# Altium footprint library AD_Lib.PcbLib: 508 footprints (part 2 of 32)
Each footprint in its own frame and in the unit in brackets; x right, y up, seen from the top. Pads: shape width x height; smd on the part's side, far side on the other; paste and mask are expansions set on the pad; w line width, h text height; cw(c..) or ccw(c..) is an arc to the next point about the centre after c.
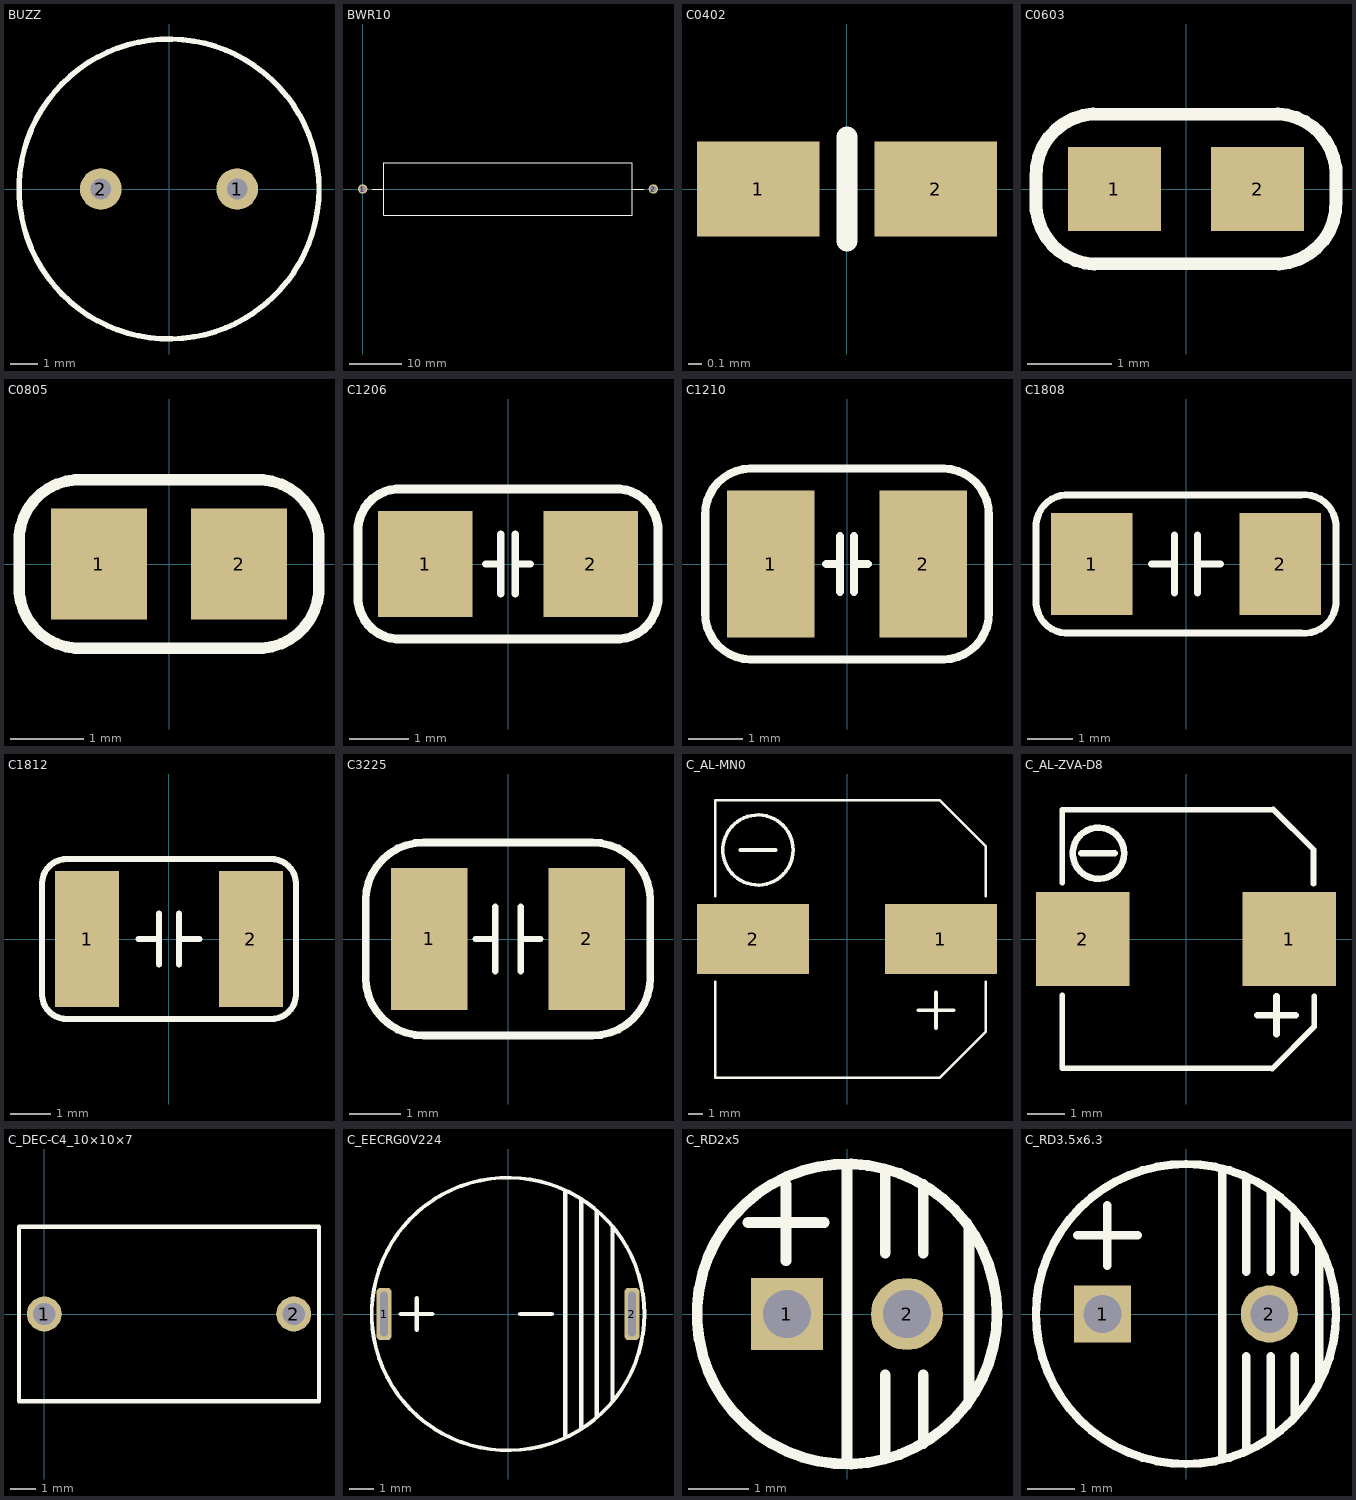
[diagram p1: the footprints below, top view; thin cyan lines are the x and y axes]

## BUZZ [mil]
height 104
pads (2):
  round 60 hole 30: 1(98.43,0) 2(-98.43,0)
Top Overlay:
  circle w7.87: c0,0 r216.54

## BWR10 [mm] "KOA之BWR10系列水泥电阻，10W"
height 8.6
pads (2):
  round 1.8 hole 1.2: 1(0,0) 2(55.88,0)
Top Overlay:
  lines w0.2: 1.8,0 4.075,0 ; 51.805,0 54.08,0 ; 4.075,0 4.075,5.08 51.805,5.08 51.805,-5.08 4.075,-5.08 4.075,0

## C0402 [mm] "贴片电容，耐压10V"
pads (2):
  rect 0.9x0.7 smd: 1(-0.65,0) 2(0.65,0)
Top Overlay:
  lines w0.152: 0,-0.381 0,0.381

## C0603 [mm] "公制1608；英制0603"
height 0.4
pads (2):
  rect 1.1x1 smd: 1(-0.85,0) 2(0.85,0)
Top Overlay:
  lines w0.152: -1.782,-0.254 -1.782,0.133 cw(c-1.06,0.171) -0.977,0.889 ; -1.778,-0.254 ccw(c-1.06,-0.171) -0.977,-0.889 ; -1.143,-0.889 1.143,-0.889 ; -1.143,0.889 1.143,0.889 ; 0.977,-0.889 ccw(c1.06,-0.171) 1.782,-0.133 1.782,0.254 ; 0.977,0.889 cw(c1.06,0.171) 1.778,0.254

## C0805 [mm] "公制2012；英制0805"
height 0.5
pads (2):
  rect 1.3x1.5 smd: 1(-0.95,0) 2(0.95,0)
Top Overlay:
  lines w0.152: -2.032,-0.254 ccw(c-1.206,-0.318) -1.27,-1.143 1.27,-1.143 ccw(c1.206,-0.318) 2.032,-0.254 2.032,0.254 ccw(c1.206,0.318) 1.27,1.143 -1.27,1.143 ccw(c-1.206,0.318) -2.032,0.254 -2.032,-0.254

## C1206 [mm] "公制3216；英制1206；"
height 0.71
pads (2):
  rect 1.6x1.8 smd: 1(-1.4,0) 2(1.4,0)
Top Overlay:
  lines w0.127: -0.381,0 -0.127,0 ; -0.127,-0.508 -0.127,0.508 ; 0.127,-0.508 0.127,0.508 ; 0.127,0 0.381,0
  lines w0.152: -2.54,-0.635 ccw(c-1.841,-0.572) -1.778,-1.27 1.778,-1.27 ccw(c1.841,-0.572) 2.54,-0.635 2.54,0.635 ccw(c1.841,0.572) 1.778,1.27 -1.778,1.27 ccw(c-1.841,0.572) -2.54,0.635 -2.54,-0.635

## C1210 [mm] "Chip Capacitor; Body 1.2x 1.0 mm (LxW typ)"
height 2.03
pads (2):
  rect 1.6x2.7 smd: 1(-1.4,0) 2(1.4,0)
Top Overlay:
  lines w0.152: -0.381,0 -0.127,0 ; -0.127,-0.508 -0.127,0.508 ; 0.127,-0.508 0.127,0.508 ; 0.127,0 0.381,0 ; -2.6,-0.889 ccw(c-1.759,-0.908) -1.778,-1.75 1.778,-1.75 ccw(c1.759,-0.908) 2.6,-0.889 2.6,0.889 ccw(c1.759,0.908) 1.778,1.75 -1.778,1.75 ccw(c-1.759,0.908) -2.6,0.889 -2.6,-0.889

## C1808 [mm] "Chip Capacitor; Body 4.5 x 2.0 mm (LxW typ)"
height 2.03
pads (2):
  rect 1.8x2.25 smd: 1(-2.075,0) 2(2.075,0)
Top Overlay:
  lines w0.152: -2.667,-1.524 2.54,-1.524 ccw(c2.603,-0.826) 3.302,-0.889 3.302,0.889 ccw(c2.603,0.826) 2.54,1.524 -2.667,1.524 -2.54,1.524 ccw(c-2.603,0.826) -3.302,0.889 -3.302,-0.889 ccw(c-2.603,-0.826) -2.54,-1.524 ; -0.762,0 -0.254,0 ; -0.254,-0.635 -0.254,0.635 ; 0.254,-0.635 0.254,0.635 ; 0.254,0 0.762,0

## C1812 [mm] "公制4832；英制1812；"
height 0.7
pads (2):
  rect 1.6x3.4 smd: 1(-2.05,0) 2(2.05,0)
Top Overlay:
  lines w0.152: -0.762,0 -0.254,0 ; -0.254,-0.635 -0.254,0.635 ; 0.254,-0.635 0.254,0.635 ; 0.254,0 0.762,0 ; -3.175,-1.397 ccw(c-2.556,-1.381) -2.54,-2 2.54,-2 ccw(c2.556,-1.381) 3.175,-1.397 3.175,1.397 ccw(c2.556,1.381) 2.54,2 -2.54,2 ccw(c-2.556,1.381) -3.175,1.397 -3.175,-1.397

## C3225 [mm] "公制3225；英制1210； IPC Low Density"
height 1.35
pads (2):
  rect 1.5x2.8 smd: 1(-1.55,0) 2(1.55,0)
Top Overlay:
  lines w0.127: -0.635,0 -0.254,0 ; -0.254,-0.635 -0.254,0.635 ; 0.254,-0.635 0.254,0.635 ; 0.254,0 0.635,0
  lines w0.152: -2.8,-0.762 ccw(c-1.656,-0.757) -1.651,-1.9 1.651,-1.9 ccw(c1.656,-0.757) 2.8,-0.762 2.8,0.762 ccw(c1.656,0.757) 1.651,1.9 -1.651,1.9 ccw(c-1.656,0.757) -2.8,0.762 -2.8,-0.762

## C_AL-MN0 [mm] "铝聚合物电容；MVY系列，MN0；EMVY350GDA222MMN0S"
height 22
pads (2):
  rect 8x5 smd: 1(6.7,0) 2(-6.7,0)
Top Overlay:
  circle w0.254: c-6.35,6.35 r2.502
  lines w0.178: -9.398,-3.048 -9.398,-9.906 6.604,-9.906 9.906,-6.604 9.906,-3.048 ; -9.398,3.048 -9.398,9.906 6.604,9.906 9.906,6.604 9.906,3.048
  lines w0.254: -7.62,6.35 -5.08,6.35 ; 5.08,-5.08 7.62,-5.08 ; 6.35,-6.35 6.35,-3.81

## C_AL-ZVA-D8 [mm] "Panasonic， Series : ZA  Type : V"
height 8
pads (2):
  rect 2.5x2.5 smd paste-0.051 mask+0.076: 1(2.75,0) 2(-2.75,0)
Top Overlay:
  circle w0.178: c-2.335,2.286 r0.684
  lines w0.152: -3.3,-1.5 -3.3,-3.45 2.3,-3.45 ; -3.3,1.5 -3.3,3.45 ; -3.285,3.45 2.3,3.45 ; 2.303,-3.454 3.408,-2.349 ; 2.329,3.454 3.4,2.383 3.4,1.473 ; 3.421,-2.337 3.421,-1.524
  lines w0.178: -2.794,2.286 -1.905,2.286 ; 1.905,-2.032 2.921,-2.032 ; 2.413,-2.54 2.413,-1.524

## C_DEC-C4_10×10×7 [mm] "Muruta之DE系列高压瓷片电容，引脚间距=10mm，尺寸 = D × F × T"
height 12.5
pads (2):
  round 1.4 hole 0.9: 1(0,0) 2(10,0)
Top Overlay:
  lines w0.178: -1.016,-3.5 11.016,-3.5 11.016,3.5 -1.016,3.5 -1.016,-3.5

## C_EECRG0V224 [mm] "超级电容，Panasonic之EECRG0V224H"
height 6
pads (2):
  rrect50% 0.6x2.1 hole 0.3 slot 1.8 at 90 deg: 1(-5,0) 2(5,0)
Top Overlay:
  circle w0.152: c0,0 r5.5
  lines w0.178: -4.318,0 -3.048,0 ; -3.683,-0.635 -3.683,0.635 ; 0.5,0 1.77,0 ; 2.311,-4.978 2.311,4.928 ; 2.946,-4.597 2.946,4.623 ; 3.581,-4.115 3.581,4.14 ; 4.216,-3.505 4.216,3.505
Bottom Overlay:
  lines w0.178: -4.318,0 -3.048,0 ; -3.683,-0.635 -3.683,0.635

## C_RD2x5 [mm] "直插电解电容"
height 11
pads (2):
  rect 1.2x1.2 hole 0.8: 1(-1,0)
  round 1.2 hole 0.8: 2(1,0)
Top Overlay:
  circle w0.178: c0,0 r2.5
  lines w0.178: -1.651,1.524 -0.381,1.524 ; -1.016,0.889 -1.016,2.159 ; 0,-2.413 0,2.413 ; 0.635,-2.413 0.635,-1.016 ; 0.635,1.016 0.635,2.413 ; 1.27,-2.159 1.27,-1.016 ; 1.27,1.016 1.27,2.159 ; 2.032,-1.397 2.032,1.397
Bottom Overlay:
  lines w0.178: -1.651,1.524 -0.381,1.524 ; -1.016,0.889 -1.016,2.159 ; 0.508,1.524 1.778,1.524

## C_RD3.5x6.3 [mm] "直插电解电容"
height 16
pads (2):
  rect 1.2x1.2 hole 0.8: 1(-1.75,0)
  round 1.2 hole 0.8: 2(1.75,0)
Top Overlay:
  circle w0.178: c0,0 r3.15
  lines w0.178: -2.286,1.651 -1.016,1.651 ; -1.651,1.016 -1.651,2.286 ; 0.762,-3.048 0.762,3.048 ; 1.27,-2.794 1.27,-0.889 ; 1.27,0.889 1.27,2.794 ; 1.778,-2.54 1.778,-0.889 ; 1.778,0.889 1.778,2.54 ; 2.286,-2.159 2.286,-0.889 ; 2.286,0.889 2.286,2.159 ; 2.794,-1.397 2.794,1.397
Bottom Overlay:
  lines w0.178: -2.286,1.651 -1.016,1.651 ; -1.651,1.016 -1.651,2.286 ; 1.016,1.651 2.286,1.651